# Altium footprint library 19-Resistors.PcbLib: 199 footprints (part 7 of 13)
Each footprint in its own frame and in the unit in brackets; x right, y up, seen from the top. Pads: shape width x height; smd on the part's side, far side on the other; paste and mask are expansions set on the pad; w line width, h text height; cw(c..) or ccw(c..) is an arc to the next point about the centre after c.
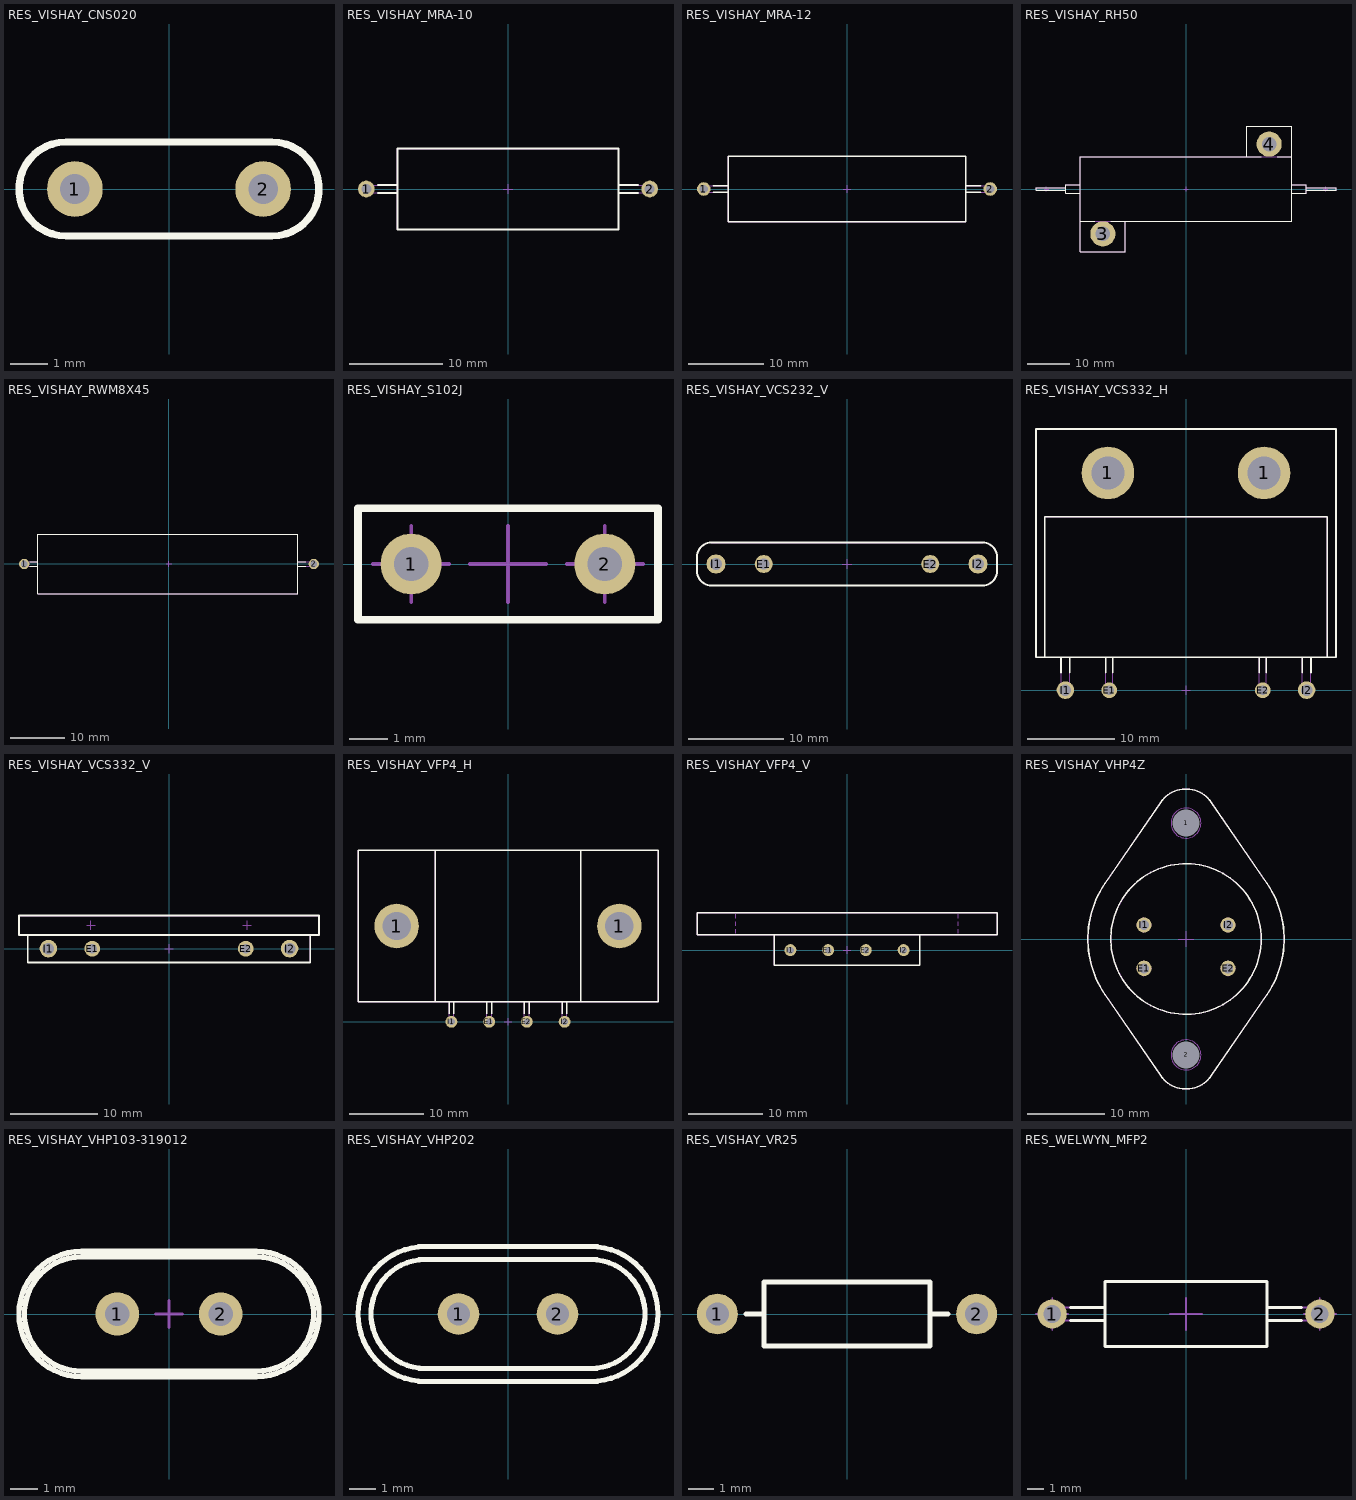
[diagram p6: the footprints below, top view; thin cyan lines are the x and y axes]

## RES_VISHAY_CNS020 [mm] "Resistor, Radial, Pad spacing 5.08mm - Body 8.1mm x 2.54mm"
height 6.62
pads (2):
  round 1.5 hole 0.8: 1(-2.54,0) 2(2.54,0)
Top Overlay:
  lines w0.2: -2.78,-1.27 cw(c-2.78,0) -2.78,1.27 2.78,1.27 cw(c2.78,0) 2.78,-1.27 -2.78,-1.27
Mechanical 14:
  lines w0.1: -2.78,-1.27 cw(c-2.78,0) -2.78,1.27 2.78,1.27 cw(c2.78,0) 2.78,-1.27 -2.78,-1.27
3D body "v200-130.stp": height 0.02, standoff -1.65, extent 1.54,-1 3.54,1
3D body "v200-130.stp": height 0.02, standoff -1.65, extent -3.54,-1 -1.54,1
3D body "RES_VISHAY_CNS020.stp": height 6.62, standoff -3.6, extent -4.05,-1.27 4.05,1.27

## RES_VISHAY_MRA-10 [mm] "Resistor, Axial, Pad spacing 30.48mm - Body Lengh 22.22mm X Body Diameter 7.92mm"
height 8.71
pads (2):
  round 1.8 hole 1.1: 1(-15.24,0) 2(15.24,0)
Top Overlay:
  lines w0.2: -14.011,-0.425 -11.895,-0.425 ; -14.011,0.425 -11.895,0.425 ; 11.895,-0.425 14.011,-0.425 ; 11.895,0.425 14.011,0.425 ; -11.895,-4.355 -11.895,4.355 11.895,4.355 11.895,-4.355 -11.895,-4.355
Mechanical 8:
  lines w0.1: -15.74,0 -15.24,0 ; -15.24,-0.5 -15.24,0 ; -15.24,0.5 -15.24,0 ; -14.74,0 -15.24,0 ; -0.5,0 0,0 ; 0,-0.5 0,0 ; 0,0.5 0,0 ; 0.5,0 0,0 ; 14.74,0 15.24,0 ; 15.24,-0.5 15.24,0 ; 15.24,0.5 15.24,0 ; 15.74,0 15.24,0
Mechanical 14:
  lines w0.1: -11.895,-0.425 -15.24,-0.425 cw(c-15.24,0) -15.24,0.425 -11.895,0.425 ; 11.895,-0.425 15.24,-0.425 ccw(c15.24,0) 15.24,0.425 11.895,0.425 ; -11.895,-4.355 -11.895,4.355 11.895,4.355 11.895,-4.355 -11.895,-4.355
3D body "v200-130.stp": height 0.02, standoff -1.65, extent 14.24,-1 16.24,1
3D body "v200-130.stp": height 0.02, standoff -1.65, extent -16.24,-1 -14.24,1
3D body "RES_VISHAY_RMA-10.stp": height 8.71, standoff -3.8, extent -15.665,-4.355 15.665,4.355

## RES_VISHAY_MRA-12 [mm] "Resistor, Axial, Pad spacing 38.1mm - Body Lengh 30.17mm X Body Diameter 7.92mm"
height 8.71
pads (2):
  round 1.8 hole 1.1: 1(-19.05,0) 2(19.05,0)
Top Overlay:
  lines w0.2: -17.821,-0.425 -15.765,-0.425 ; -17.821,0.425 -15.765,0.425 ; 15.765,-0.425 17.821,-0.425 ; 15.765,0.425 17.821,0.425 ; -15.765,-4.355 -15.765,4.355 15.765,4.355 15.765,-4.355 -15.765,-4.355
Mechanical 8:
  lines w0.1: -19.55,0 -19.05,0 ; -19.05,-0.5 -19.05,0 ; -19.05,0.5 -19.05,0 ; -18.55,0 -19.05,0 ; -0.5,0 0,0 ; 0,-0.5 0,0 ; 0,0.5 0,0 ; 0.5,0 0,0 ; 18.55,0 19.05,0 ; 19.05,-0.5 19.05,0 ; 19.05,0.5 19.05,0 ; 19.55,0 19.05,0
Mechanical 14:
  lines w0.1: -15.765,-0.425 -19.05,-0.425 cw(c-19.05,0) -19.05,0.425 -15.765,0.425 ; 15.765,-0.425 19.05,-0.425 ccw(c19.05,0) 19.05,0.425 15.765,0.425 ; -15.765,-4.355 -15.765,4.355 15.765,4.355 15.765,-4.355 -15.765,-4.355
3D body "v200-130.stp": height 0.02, standoff -1.65, extent 18.05,-1 20.05,1
3D body "v200-130.stp": height 0.02, standoff -1.65, extent -20.05,-1 -18.05,1
3D body "RES_VISHAY_MRA-12.stp": height 8.71, standoff -3.8, extent -19.475,-4.355 19.475,4.355

## RES_VISHAY_RH50 [mm] "Heatsink Encased Wirewound Power Resistors - Body Lengh 50mm X Body Width 15.5mm"
height 15
pads (2):
  round 6 hole 3.5: 3(-19.85,-10.7) 4(19.85,10.7)
Top Overlay:
  lines w0.2: -28.7,-0.25 -35.8,-0.25 -35.8,0.25 -28.7,0.25 ; -25.25,-7.75 -21.733,-7.75 ; -25.25,-1 -28.7,-1 -28.7,1 -25.25,1 ; -17.967,-7.75 25.25,-7.75 25.25,14.95 14.45,14.95 14.45,7.75 ; -14.45,-7.75 -14.45,-14.95 -25.25,-14.95 -25.25,7.75 17.967,7.75 ; 21.733,7.75 25.25,7.75 ; 25.25,-1 28.7,-1 28.7,1 25.25,1 ; 28.7,-0.25 35.8,-0.25 35.8,0.25 28.7,0.25
Mechanical 8:
  lines w0.1: -33.8,0 -33.3,0 ; -33.3,-0.5 -33.3,0 ; -33.3,0.5 -33.3,0 ; -32.8,0 -33.3,0 ; -20.35,-10.7 -19.85,-10.7 ; -19.85,-11.2 -19.85,-10.7 ; -19.85,-10.2 -19.85,-10.7 ; -19.35,-10.7 -19.85,-10.7 ; 19.35,10.7 19.85,10.7 ; 19.85,10.2 19.85,10.7 ; 19.85,11.2 19.85,10.7 ; 20.35,10.7 19.85,10.7 ; 32.8,0 33.3,0 ; 33.3,-0.5 33.3,0 ; 33.3,0.5 33.3,0 ; 33.8,0 33.3,0 ; 0,0 0,0.5 0,0 ; 0,0 -0.5,0 0,0 ; 0,0 0,-0.5 0,0 ; 0,0 0.5,0 0,0
Mechanical 14:
  circle w0.1: c-19.85,-10.7 r1.6
  circle w0.1: c19.85,10.7 r1.6
  lines w0.1: -28.7,-0.25 -35.8,-0.25 -35.8,0.25 -28.7,0.25 ; -25.25,-7.75 25.25,-7.75 25.25,14.95 14.45,14.95 14.45,7.75 ; -25.25,-1 -28.7,-1 -28.7,1 -25.25,1 ; -14.45,-7.75 -14.45,-14.95 -25.25,-14.95 -25.25,7.75 25.25,7.75 ; 25.25,-1 28.7,-1 28.7,1 25.25,1 ; 28.7,-0.25 35.8,-0.25 35.8,0.25 28.7,0.25
3D body "v200-130.stp": height 0.02, standoff -1.65, extent 18.85,9.7 20.85,11.7
3D body "v200-130.stp": height 0.02, standoff -1.65, extent -20.85,-11.7 -18.85,-9.7
3D body "RES_VISHAY_RH50.stp": height 15, standoff 0, extent -35.8,-14.95 35.8,14.95

## RES_VISHAY_RWM8X45 [mm] "Resistor, Axial, Leads Spacing 52mm, Lead Dia. 0.8, Body Lengh 45.8mm, Diameter 9.4mm"
height 10.9
pads (2):
  round 1.9 hole 1.2: 1(-26.67,0) 2(26.67,0)
Top Overlay:
  lines w0.2: -25.627,-0.45 -24.13,-0.45 ; -25.627,0.45 -24.13,0.45 ; 23.67,-0.45 25.167,-0.45 ; 23.67,0.45 25.167,0.45 ; -24.13,-5.45 -24.13,5.45 23.67,5.45 23.67,-5.45 -24.13,-5.45
Mechanical 8:
  lines w0.1: -27.4,0 -26.9,0 ; -26.9,-0.5 -26.9,0 ; -26.9,0.5 -26.9,0 ; -26.4,0 -26.9,0 ; -0.5,0 0,0 ; 0,-0.5 0,0 ; 0,0.5 0,0 ; 0.5,0 0,0 ; 25.94,0 26.44,0 ; 26.44,-0.5 26.44,0 ; 26.44,0.5 26.44,0 ; 26.94,0 26.44,0
Mechanical 14:
  lines w0.1: -24.13,-0.45 -26.9,-0.45 cw(c-26.9,0) -26.9,0.45 -24.13,0.45 ; 23.67,-0.45 26.44,-0.45 ccw(c26.44,0) 26.44,0.45 23.67,0.45 ; -24.13,-5.45 -24.13,5.45 23.67,5.45 23.67,-5.45 -24.13,-5.45
3D body "v200-130.stp": height 0.02, standoff -1.65, extent 25.67,-1 27.67,1
3D body "v200-130.stp": height 0.02, standoff -1.65, extent -27.67,-1 -25.67,1
3D body "RES_VISHAY_RWM8X45.stp": height 10.9, standoff -3.6, extent -27.12,-5.45 27.12,5.45

## RES_VISHAY_S102J [mm] "Resistor, Radial Rectangular, Leads  Spacing 5.08mm - Body 7.62mm X mm X 2.67mm"
height 8.53
pads (2):
  round 1.6 hole 0.9: 1(-2.54,0) 2(2.54,0)
Top Overlay:
  lines w0.2: -3.935,-1.46 3.935,-1.46 3.935,1.46 -3.935,1.46 -3.935,-1.46
Mechanical 8:
  lines w0.1: -3.54,0 -2.54,0 ; -2.54,-1 -2.54,0 ; -2.54,1 -2.54,0 ; -1.54,0 -2.54,0 ; -1,0 0,0 ; 0,-1 0,0 ; 0,1 0,0 ; 1,0 0,0 ; 1.54,0 2.54,0 ; 2.54,-1 2.54,0 ; 2.54,1 2.54,0 ; 3.54,0 2.54,0
Mechanical 14:
  lines w0.1: -3.935,-1.46 3.935,-1.46 3.935,1.46 -3.935,1.46 -3.935,-1.46
3D body "v200-130.stp": height 0.02, standoff -1.65, extent 1.54,-1 3.54,1
3D body "v200-130.stp": height 0.02, standoff -1.65, extent -3.54,-1 -1.54,1
3D body "RES_VISHAY_S102J.stp": height 7.87, standoff -3.8, extent -3.935,-1.46 3.935,1.46

## RES_VISHAY_VCS232_V [mm] "4 Leads Ultra High Precision Foil Power Current Sensing Resistor VCS232 Serie"
height 13
pads (4):
  round 1.9 hole 1.2: E1(-8.74,0) E2(8.74,0)
  round 2 hole 1.3: I1(-13.755,0) I2(13.755,0)
Top Overlay:
  lines w0.2: -15.75,-0.75 ccw(c-14.25,-0.75) -14.25,-2.25 14.25,-2.25 ccw(c14.25,-0.75) 15.75,-0.75 15.75,0.75 ccw(c14.25,0.75) 14.25,2.25 -14.25,2.25 ccw(c-14.25,0.75) -15.75,0.75 -15.75,-0.75
Mechanical 8:
  lines w0.1: -14.255,0 -13.755,0 ; -13.755,-0.5 -13.755,0 ; -13.755,0.5 -13.755,0 ; -13.255,0 -13.755,0 ; -9.24,0 -8.74,0 ; -8.74,-0.5 -8.74,0 ; -8.74,0.5 -8.74,0 ; -8.24,0 -8.74,0 ; -0.5,0 0,0 ; 0,-0.5 0,0 ; 0,0.5 0,0 ; 0.5,0 0,0 ; 8.24,0 8.74,0 ; 8.74,-0.5 8.74,0 ; 8.74,0.5 8.74,0 ; 9.24,0 8.74,0 ; 13.255,0 13.755,0 ; 13.755,-0.5 13.755,0 ; 13.755,0.5 13.755,0 ; 14.255,0 13.755,0
Mechanical 14:
  lines w0.1: -15.75,-0.75 ccw(c-14.25,-0.75) -14.25,-2.25 14.25,-2.25 ccw(c14.25,-0.75) 15.75,-0.75 15.75,0.75 ccw(c14.25,0.75) 14.25,2.25 -14.25,2.25 ccw(c-14.25,0.75) -15.75,0.75 -15.75,-0.75
3D body "v200-130.stp": height 0.02, standoff -1.65, extent 12.755,-1 14.755,1
3D body "v200-130.stp": height 0.02, standoff -1.65, extent 7.74,-1 9.74,1
3D body "v200-130.stp": height 0.02, standoff -1.65, extent -9.74,-1 -7.74,1
3D body "v200-130.stp": height 0.02, standoff -1.65, extent -14.755,-1 -12.755,1
3D body "RES_VISHAY_VCS232_v.stp": height 13, standoff -3.8, extent -15.75,-2.25 15.75,2.25

## RES_VISHAY_VCS332_H [mm] "4 Leads VISHAY VCS332 Case - Horizontal Mounting"
height 5.33
pads (6):
  round 6 hole 3.8: 1(-8.9,24.765) 1(8.9,24.765)
  round 1.8 hole 1.1: E1(-8.75,0) E2(8.75,0)
  round 2 hole 1.3: I1(-13.75,0) I2(13.75,0)
Top Overlay:
  lines w0.2: -16.1,3.765 -16.1,19.765 16.1,19.765 16.1,3.765 ; -14.25,2 -14.25,3.765 ; -13.25,2 -13.25,3.765 ; -9.15,2 -9.15,3.765 ; -8.35,2 -8.35,3.765 ; 8.35,2 8.35,3.765 ; 9.15,2 9.15,3.765 ; 13.25,2 13.25,3.765 ; 14.25,2 14.25,3.765 ; -17.1,3.765 17.1,3.765 17.1,29.765 -17.1,29.765 -17.1,3.765
Mechanical 8:
  lines w0.1: -14.25,0 -13.75,0 ; -13.75,-0.5 -13.75,0 ; -13.75,0.5 -13.75,0 ; -13.25,0 -13.75,0 ; -9.4,24.765 -8.9,24.765 ; -9.25,0 -8.75,0 ; -8.9,24.265 -8.9,24.765 ; -8.9,25.265 -8.9,24.765 ; -8.75,-0.5 -8.75,0 ; -8.75,0.5 -8.75,0 ; -8.4,24.765 -8.9,24.765 ; -8.25,0 -8.75,0 ; -0.5,0 0,0 ; 0,-0.5 0,0 ; 0,0.5 0,0 ; 0.5,0 0,0 ; 8.25,0 8.75,0 ; 8.4,24.765 8.9,24.765 ; 8.75,-0.5 8.75,0 ; 8.75,0.5 8.75,0 ; 8.9,24.265 8.9,24.765 ; 8.9,25.265 8.9,24.765 ; 9.25,0 8.75,0 ; 9.4,24.765 8.9,24.765 ; 13.25,0 13.75,0 ; 13.75,-0.5 13.75,0 ; 13.75,0.5 13.75,0 ; 14.25,0 13.75,0
Mechanical 14:
  circle w0.1: c-8.9,24.765 r1.75
  circle w0.1: c8.9,24.765 r1.75
  lines w0.1: -16.1,3.765 -16.1,19.765 16.1,19.765 16.1,3.765 ; -14.25,3.765 -14.25,0 ccw(c-13.75,0) -13.25,0 -13.25,3.765 ; -9.15,3.765 -9.15,0 ccw(c-8.75,0) -8.35,0 -8.35,3.765 ; 8.35,3.765 8.35,0 ccw(c8.75,0) 9.15,0 9.15,3.765 ; 13.25,3.765 13.25,0 ccw(c13.75,0) 14.25,0 14.25,3.765 ; -17.1,3.765 17.1,3.765 17.1,29.765 -17.1,29.765 -17.1,3.765
3D body "v200-130.stp": height 0.02, standoff -1.65, extent 12.75,-1 14.75,1
3D body "v200-130.stp": height 0.02, standoff -1.65, extent 7.75,-1 9.75,1
3D body "v200-130.stp": height 0.02, standoff -1.65, extent -9.75,-1 -7.75,1
3D body "v200-130.stp": height 0.02, standoff -1.65, extent -14.7,-1.075 -12.7,0.925
3D body "RES_VISHAY_VCS332_h.stp": height 5.33, standoff -3.6, extent -17.1,-0.5 17.1,29.765

## RES_VISHAY_VCS332_V [mm] "4 Leads VISHAY VCS332 Case - Vertical Mounting"
height 31
pads (4):
  round 1.8 hole 1.1: E1(-8.75,0) E2(8.75,0)
  round 2 hole 1.3: I1(-13.75,0) I2(13.75,0)
Top Overlay:
  lines w0.2: -16.1,1.565 -16.1,-1.565 16.1,-1.565 16.1,1.565 ; -17.1,1.565 17.1,1.565 17.1,3.765 -17.1,3.765 -17.1,1.565
Mechanical 8:
  lines w0.1: -14.25,0 -13.75,0 ; -13.75,-0.5 -13.75,0 ; -13.75,0.5 -13.75,0 ; -13.25,0 -13.75,0 ; -9.4,2.665 -8.9,2.665 ; -9.25,0 -8.75,0 ; -8.9,2.165 -8.9,2.665 ; -8.9,3.165 -8.9,2.665 ; -8.75,-0.5 -8.75,0 ; -8.75,0.5 -8.75,0 ; -8.4,2.665 -8.9,2.665 ; -8.25,0 -8.75,0 ; -0.5,0 0,0 ; 0,-0.5 0,0 ; 0,0.5 0,0 ; 0.5,0 0,0 ; 8.25,0 8.75,0 ; 8.4,2.665 8.9,2.665 ; 8.75,-0.5 8.75,0 ; 8.75,0.5 8.75,0 ; 8.9,2.165 8.9,2.665 ; 8.9,3.165 8.9,2.665 ; 9.25,0 8.75,0 ; 9.4,2.665 8.9,2.665 ; 13.25,0 13.75,0 ; 13.75,-0.5 13.75,0 ; 13.75,0.5 13.75,0 ; 14.25,0 13.75,0
Mechanical 14:
  lines w0.1: -16.1,1.565 -16.1,-1.565 16.1,-1.565 16.1,1.565 ; -17.1,1.565 17.1,1.565 17.1,3.765 -17.1,3.765 -17.1,1.565
3D body "v200-130.stp": height 0.02, standoff -1.65, extent 12.75,-1 14.75,1
3D body "v200-130.stp": height 0.02, standoff -1.65, extent 7.75,-1 9.75,1
3D body "v200-130.stp": height 0.02, standoff -1.65, extent -9.75,-1 -7.75,1
3D body "v200-130.stp": height 0.02, standoff -1.65, extent -14.75,-1 -12.75,1
3D body "RES_VISHAY_VCS332_v.stp": height 31, standoff -3.6, extent -17.1,-1.565 17.1,3.765

## RES_VISHAY_VFP4_H [mm] "4 Leads VFP4 VISHAY Case - Horizontal Mounting"
height 7.11
pads (6):
  round 6 hole 3.8: 1(-15,12.9) 1(15,12.9)
  round 1.6 hole 0.9: E1(-2.54,0) E2(2.54,0) I1(-7.62,0) I2(7.62,0)
Top Overlay:
  lines w0.2: -9.79,2.7 -9.79,23.1 ; -7.945,1.051 -7.945,2.7 ; -7.295,1.051 -7.295,2.7 ; -2.865,1.051 -2.865,2.7 ; -2.215,1.051 -2.215,2.7 ; 2.215,1.051 2.215,2.7 ; 2.865,1.051 2.865,2.7 ; 7.295,1.051 7.295,2.7 ; 7.945,1.051 7.945,2.7 ; 9.79,2.7 9.79,23.1 ; -20.21,2.7 -20.21,23.1 20.21,23.1 20.21,2.7 -20.21,2.7
Mechanical 8:
  lines w0.1: -15.5,12.9 -15,12.9 ; -15,12.4 -15,12.9 ; -15,13.4 -15,12.9 ; -14.5,12.9 -15,12.9 ; -8.12,0 -7.62,0 ; -7.62,-0.5 -7.62,0 ; -7.62,0.5 -7.62,0 ; -7.12,0 -7.62,0 ; -3.04,0 -2.54,0 ; -2.54,-0.5 -2.54,0 ; -2.54,0.5 -2.54,0 ; -2.04,0 -2.54,0 ; -0.5,0 0,0 ; 0,-0.5 0,0 ; 0,0.5 0,0 ; 0.5,0 0,0 ; 2.04,0 2.54,0 ; 2.54,-0.5 2.54,0 ; 2.54,0.5 2.54,0 ; 3.04,0 2.54,0 ; 7.12,0 7.62,0 ; 7.62,-0.5 7.62,0 ; 7.62,0.5 7.62,0 ; 8.12,0 7.62,0 ; 14.5,12.9 15,12.9 ; 15,12.4 15,12.9 ; 15,13.4 15,12.9 ; 15.5,12.9 15,12.9
Mechanical 14:
  lines w0.1: -9.79,2.7 -9.79,23.1 ; -7.945,2.7 -7.945,0 ccw(c-7.62,0) -7.295,0 -7.295,2.7 ; -2.865,2.7 -2.865,0 ccw(c-2.54,0) -2.215,0 -2.215,2.7 ; 2.215,2.7 2.215,0 ccw(c2.54,0) 2.865,0 2.865,2.7 ; 7.295,2.7 7.295,0 ccw(c7.62,0) 7.945,0 7.945,2.7 ; 9.79,2.7 9.79,23.1 ; -20.21,2.7 -20.21,23.1 20.21,23.1 20.21,2.7 -20.21,2.7
3D body "v200-130.stp": height 0.02, standoff -1.65, extent 6.62,-1 8.62,1
3D body "v200-130.stp": height 0.02, standoff -1.65, extent 1.45,-1.075 3.45,0.925
3D body "v200-130.stp": height 0.02, standoff -1.65, extent -3.54,-1 -1.54,1
3D body "v200-130.stp": height 0.02, standoff -1.65, extent -8.62,-1 -6.62,1
3D body "RES_VISHAY_VFP-4_h.stp": height 7.11, standoff -3.6, extent -20.21,-0.325 20.21,23.1

## RES_VISHAY_VFP4_V [mm] "4 Leads VFP4 VISHAY Case - Vertical Mounting"
height 25.4
pads (4):
  round 1.6 hole 0.9: E1(-2.54,0) E2(2.54,0) I1(-7.62,0) I2(7.62,0)
Top Overlay:
  lines w0.2: -9.79,2.055 -9.79,-2.055 9.79,-2.055 9.79,2.055 ; -20.21,2.055 20.21,2.055 20.21,5.055 -20.21,5.055 -20.21,2.055
Mechanical 8:
  lines w0.1: -15,2.305 -15,2.805 ; -15,3.305 -15,3.555 -15,3.805 ; -15,4.305 -15,4.805 ; -8.12,0 -7.62,0 ; -7.62,-0.5 -7.62,0 ; -7.62,0.5 -7.62,0 ; -7.12,0 -7.62,0 ; -3.04,0 -2.54,0 ; -2.54,-0.5 -2.54,0 ; -2.54,0.5 -2.54,0 ; -2.04,0 -2.54,0 ; -0.5,0 0,0 ; 0,-0.5 0,0 ; 0,0.5 0,0 ; 0.5,0 0,0 ; 2.04,0 2.54,0 ; 2.54,-0.5 2.54,0 ; 2.54,0.5 2.54,0 ; 3.04,0 2.54,0 ; 7.12,0 7.62,0 ; 7.62,-0.5 7.62,0 ; 7.62,0.5 7.62,0 ; 8.12,0 7.62,0 ; 15,2.305 15,2.805 ; 15,3.305 15,3.555 15,3.805 ; 15,4.305 15,4.805
Mechanical 14:
  lines w0.1: -9.79,2.055 -9.79,-2.055 9.79,-2.055 9.79,2.055 ; -20.21,2.055 20.21,2.055 20.21,5.055 -20.21,5.055 -20.21,2.055
3D body "v200-130.stp": height 0.02, standoff -1.65, extent 6.62,-1 8.62,1
3D body "v200-130.stp": height 0.02, standoff -1.65, extent 1.54,-1 3.54,1
3D body "v200-130.stp": height 0.02, standoff -1.65, extent -3.54,-1 -1.54,1
3D body "v200-130.stp": height 0.02, standoff -1.65, extent -8.62,-1 -6.62,1
3D body "RES_VISHAY_VFP-4_v.stp": height 25.4, standoff -3, extent -20.21,-2.055 20.21,5.055

## RES_VISHAY_VHP4Z [mm] "TO-3, 4 Leads VISHAY Case"
height 8.64
pads (6):
  round 1 hole 3.5 unplated: 1(0,15.065) 2(0,-15.065)
  round 2 hole 1.3: E1(-5.46,-3.815) E2(5.46,-3.815) I1(-5.46,1.825) I2(5.46,1.825)
Top Overlay:
  circle w0.2: c0,0 r9.779
  lines w0.2: -10.526,-7.221 cw(c0,0) -10.526,7.221 -3.299,17.758 cw(c0,15.495) 3.299,17.758 10.526,7.221 cw(c0,0) 10.526,-7.221 3.299,-17.758 cw(c0,-15.495) -3.299,-17.758 -10.526,-7.221
Mechanical 8:
  lines w0.1: -6.46,-3.815 -5.46,-3.815 ; -6.46,1.825 -5.46,1.825 ; -5.46,-4.815 -5.46,-3.815 ; -5.46,-2.815 -5.46,-3.815 ; -5.46,0.825 -5.46,1.825 ; -5.46,2.825 -5.46,1.825 ; -4.46,-3.815 -5.46,-3.815 ; -4.46,1.825 -5.46,1.825 ; -1,-15.065 0,-15.065 ; -1,0 0,0 ; -1,15.065 0,15.065 ; 0,-16.065 0,-15.065 ; 0,-14.065 0,-15.065 ; 0,-1 0,0 ; 0,1 0,0 ; 0,14.065 0,15.065 ; 0,16.065 0,15.065 ; 1,-15.065 0,-15.065 ; 1,0 0,0 ; 1,15.065 0,15.065 ; 4.46,-3.815 5.46,-3.815 ; 4.46,1.825 5.46,1.825 ; 5.46,-4.815 5.46,-3.815 ; 5.46,-2.815 5.46,-3.815 ; 5.46,0.825 5.46,1.825 ; 5.46,2.825 5.46,1.825 ; 6.46,-3.815 5.46,-3.815 ; 6.46,1.825 5.46,1.825
Mechanical 14:
  circle w0.1: c-5.46,1.825 r0.5
  circle w0.1: c-5.46,-3.815 r0.5
  circle w0.1: c5.46,-3.815 r0.5
  circle w0.1: c5.46,1.825 r0.5
  circle w0.1: c0,-15.065 r1.95
  circle w0.1: c0,15.065 r1.95
  circle w0.1: c0,0 r9.779
  lines w0.1: -10.526,-7.221 cw(c0,0) -10.526,7.221 -3.299,17.758 cw(c0,15.495) 3.299,17.758 10.526,7.221 cw(c0,0) 10.526,-7.221 3.299,-17.758 cw(c0,-15.495) -3.299,-17.758 -10.526,-7.221
3D body "v200-130.stp": height 0.02, standoff -1.65, extent 4.46,0.825 6.46,2.825
3D body "v200-130.stp": height 0.02, standoff -1.65, extent 4.46,-4.815 6.46,-2.815
3D body "v200-130.stp": height 0.02, standoff -1.65, extent -6.46,-4.815 -4.46,-2.815
3D body "v200-130.stp": height 0.02, standoff -1.65, extent -6.46,0.825 -4.46,2.825
3D body "RES_VISHAY_VHP4Z.stp": height 8.64, standoff -11.43, extent -12.765,-19.495 12.765,19.495

## RES_VISHAY_VHP103-319012 [mm] "Resistor, Radial, Pad spacing 5.08mm - Body 4.62mm X 11.05mm X 10.92mm H"
height 13.97
pads (2):
  round 1.6 hole 0.9: 1(-1.905,0) 2(1.905,0)
Top Overlay:
  lines w0.2: -3.215,-2.31 cw(c-3.215,0) -3.215,2.31 3.215,2.31 cw(c3.215,0) 3.215,-2.31 -3.215,-2.31 ; -3.215,-2.11 cw(c-3.215,0) -3.215,2.11 3.215,2.11 cw(c3.215,0) 3.215,-2.11 -3.215,-2.11
Mechanical 8:
  lines w0.1: -2.395,0 -1.895,0 ; -1.895,-0.5 -1.895,0 ; -1.895,0.5 -1.895,0 ; -1.395,0 -1.895,0 ; -0.5,0 0,0 ; 0,-0.5 0,0 ; 0,0.5 0,0 ; 0.5,0 0,0 ; 1.395,0 1.895,0 ; 1.895,-0.5 1.895,0 ; 1.895,0.5 1.895,0 ; 2.395,0 1.895,0
Mechanical 14:
  lines w0.1: -3.215,-2.31 cw(c-3.215,0) -3.215,2.31 3.215,2.31 cw(c3.215,0) 3.215,-2.31 -3.215,-2.31 ; -3.215,-2.11 cw(c-3.215,0) -3.215,2.11 3.215,2.11 cw(c3.215,0) 3.215,-2.11 -3.215,-2.11
3D body "v200-130.stp": height 0.02, standoff -1.65, extent 0.905,-1 2.905,1
3D body "v200-130.stp": height 0.02, standoff -1.65, extent -2.905,-1 -0.905,1
3D body "RES_VISHAY_VHP103-319012.stp": height 13.97, standoff -3.16, extent -5.525,-2.31 5.525,2.31

## RES_VISHAY_VHP202 [mm] "Resistor, Radial, Pad spacing 3.81mm - Body 5.21mm X 11.56mm X 13.84mm H"
height 11.43
pads (2):
  round 1.6 hole 0.9: 1(-1.905,0) 2(1.905,0)
Top Overlay:
  lines w0.2: -3.175,-2.6 cw(c-3.175,0) -3.175,2.6 3.175,2.6 cw(c3.175,0) 3.175,-2.6 -3.175,-2.6 ; -3.175,-2.1 cw(c-3.175,0) -3.175,2.1 3.175,2.1 cw(c3.175,0) 3.175,-2.1 -3.175,-2.1
Mechanical 14:
  circle w0.1: c-1.905,0 r0.6
  circle w0.1: c1.905,0 r0.6
  lines w0.1: -3.175,-2.6 cw(c-3.175,0) -3.175,2.6 3.175,2.6 cw(c3.175,0) 3.175,-2.6 -3.175,-2.6 ; -3.175,-2.1 cw(c-3.175,0) -3.175,2.1 3.175,2.1 cw(c3.175,0) 3.175,-2.1 -3.175,-2.1
3D body "v200-130.stp": height 0.02, standoff -1.65, extent 0.905,-1 2.905,1
3D body "v200-130.stp": height 0.02, standoff -1.65, extent -2.905,-1 -0.905,1
3D body "RES_VISHAY_VHP202.stp": height 13.84, standoff -3.6, extent -5.78,-2.6 5.77,2.6

## RES_VISHAY_VR25 [mm] "Resistor, Axial, Pad spacing 10.16 mm - Body Lengh 6.5mm X Body Diameter 2.5mm"
height 2.5
pads (2):
  round 1.6 hole 0.9: 1(-5.08,0) 2(5.08,0)
Top Overlay:
  lines w0.2: -3.95,0 -3.25,0 ; 3.25,0 3.95,0 ; -3.25,-1.25 3.25,-1.25 3.25,1.25 -3.25,1.25 -3.25,-1.25
Mechanical 14:
  lines w0.1: -3.95,0 -3.25,0 ; 3.25,0 3.95,0 ; -3.25,-1.25 -3.25,1.25 3.25,1.25 3.25,-1.25 -3.25,-1.25
3D body "v200-130.stp": height 0.02, standoff -1.65, extent 4.08,-1 6.08,1
3D body "v200-130.stp": height 0.02, standoff -1.65, extent -6.08,-1 -4.08,1
3D body "RES_VISHAY_VR25.stp": height 2.51, standoff -3.2, extent -5.38,-1.27 5.38,1.26

## RES_WELWYN_MFP2 [mm] "Resistor, Axial, Pad spacing 16.51 mm - Body Lengh 10mm X Body Diameter 4mm"
height 4
pads (2):
  round 1.8 hole 1.1: 1(-8.255,0) 2(8.255,0)
Top Overlay:
  lines w0.2: -7.124,-0.4 -5,-0.4 ; -7.124,0.4 -5,0.4 ; 5,-0.4 7.124,-0.4 ; 5,0.4 7.124,0.4 ; -5,-2 5,-2 5,2 -5,2 -5,-2
Mechanical 8:
  lines w0.1: -9.255,0 -8.255,0 ; -8.255,-1 -8.255,0 ; -8.255,1 -8.255,0 ; -7.255,0 -8.255,0 ; -1,0 0,0 ; 0,-1 0,0 ; 0,1 0,0 ; 1,0 0,0 ; 7.255,0 8.255,0 ; 8.255,-1 8.255,0 ; 8.255,1 8.255,0 ; 9.255,0 8.255,0
Mechanical 14:
  lines w0.1: -5,-0.4 -8.255,-0.4 cw(c-8.255,0) -8.255,0.4 -5,0.4 ; 5,-0.4 8.255,-0.4 ccw(c8.255,0) 8.255,0.4 5,0.4 ; -5,-2 5,-2 5,2 -5,2 -5,-2
3D body "v200-130.stp": height 0.02, standoff -1.65, extent 7.255,-1 9.255,1
3D body "v200-130.stp": height 0.02, standoff -1.65, extent -9.255,-1 -7.255,1
3D body "RES_WELWYN_MFP2.stp": height 4, standoff -3.1, extent -8.645,-1.95 8.665,2.05